# Altium footprint library lib_protel_HC.PCBLIB: 724 footprints (part 45 of 46)
Each footprint in its own frame and in the unit in brackets; x right, y up, seen from the top. Pads: shape width x height; smd on the part's side, far side on the other; paste and mask are expansions set on the pad; w line width, h text height; cw(c..) or ccw(c..) is an arc to the next point about the centre after c.
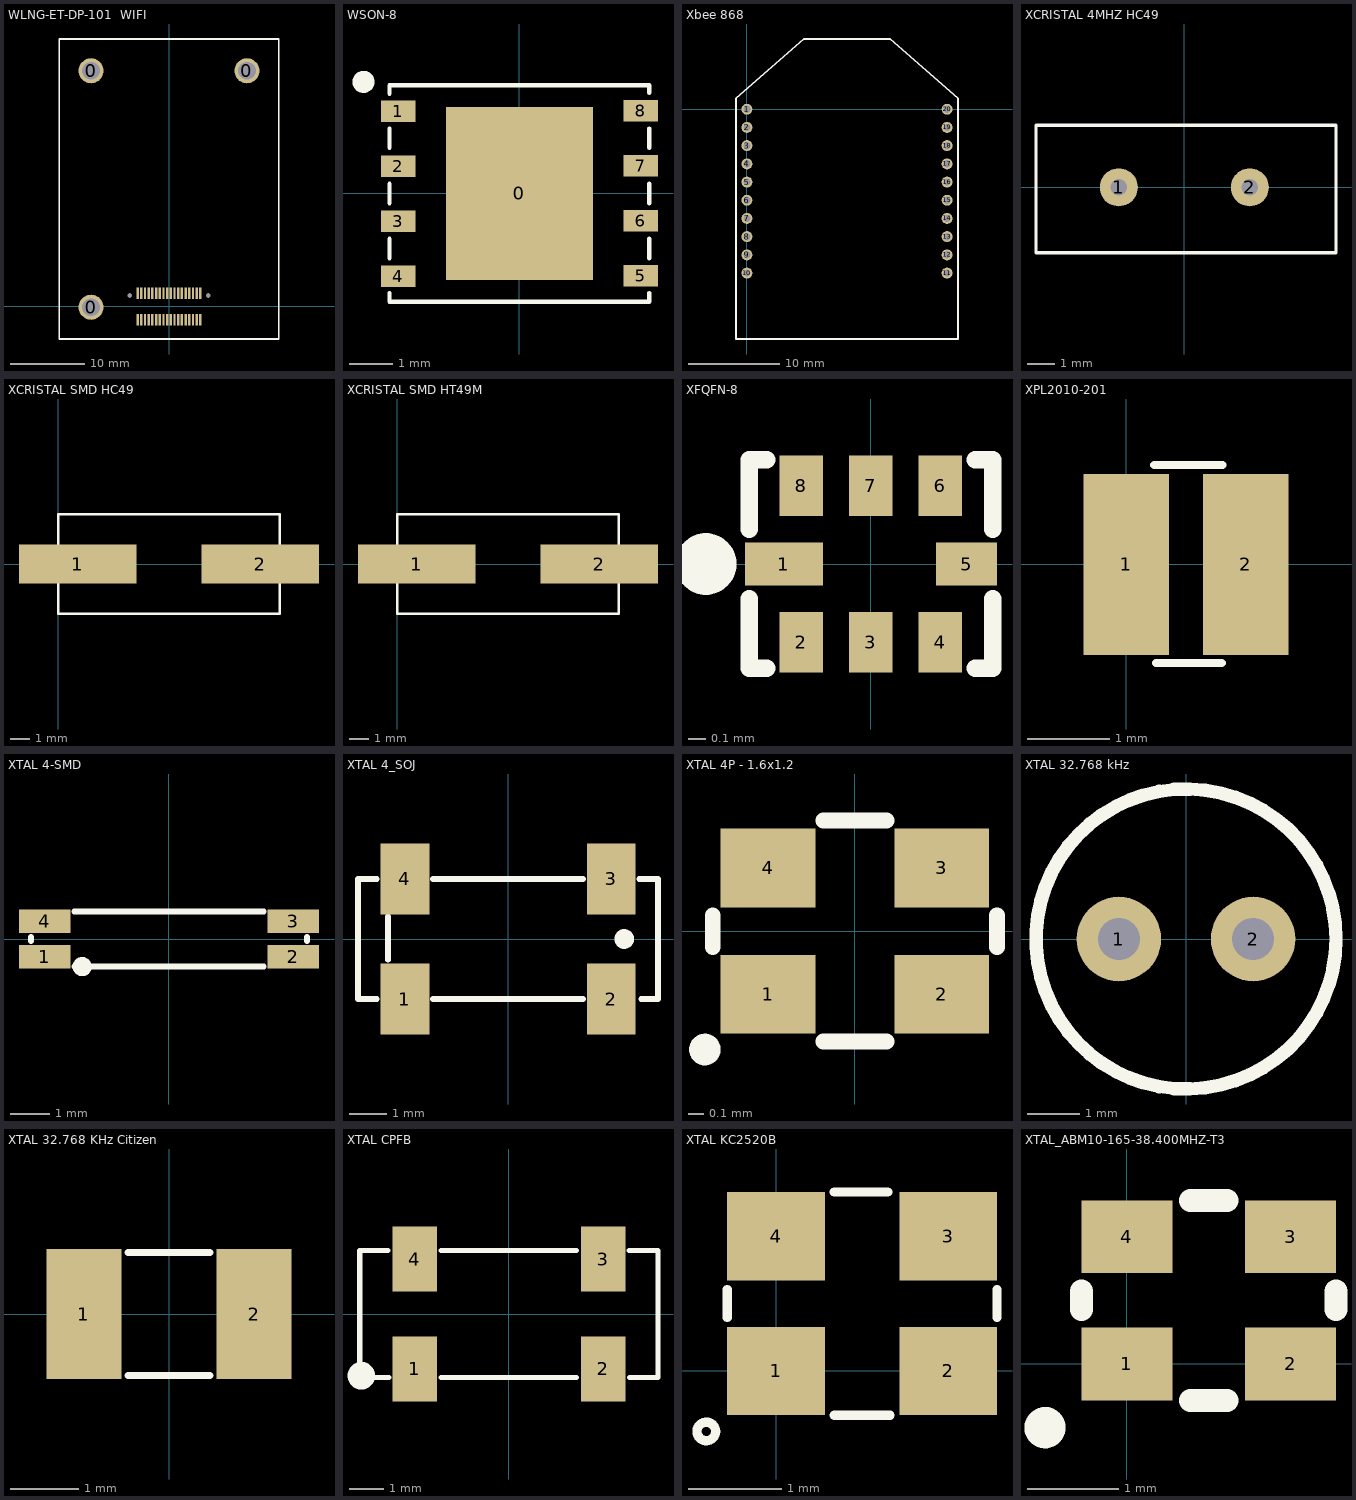
[diagram p44: the footprints below, top view; thin cyan lines are the x and y axes]

## WLNG-ET-DP-101  WIFI [mm]
height 12.92
pads (41):
  round 3.4 hole 2.4: 0(-10.55,-0.1) 0(-10.55,31.9) 0(10.55,31.9)
  rect 0x0 hole 0.65: 0(-5.3,1.5) 0(5.3,1.5)
  rect 0.32x1.6 smd: 1(4.25,-1.8) 2(4.25,1.8) 3(3.75,-1.8) 4(3.75,1.8) 5(3.25,-1.8) 6(3.25,1.8) 7(2.75,-1.8) 8(2.75,1.8) 9(2.25,-1.8) 10(2.25,1.8) 11(1.75,-1.8) 12(1.75,1.8) 13(1.25,-1.8) 14(1.25,1.8) 15(0.75,-1.8) 16(0.75,1.8) 17(0.25,-1.8) 18(0.25,1.8) 19(-0.25,-1.8) 20(-0.25,1.8) 21(-0.75,-1.8) 22(-0.75,1.8) 23(-1.25,-1.8) 24(-1.25,1.8) 25(-1.75,-1.8) 26(-1.75,1.8) 27(-2.25,-1.8) 28(-2.25,1.8) 29(-2.75,-1.8) 30(-2.75,1.8) 31(-3.25,-1.8) 32(-3.25,1.8) 33(-3.75,-1.8) 34(-3.75,1.8) 35(-4.25,-1.8) 36(-4.25,1.8)
Top Overlay:
  lines w0.254: -14.85,-4.4 14.85,-4.4 14.85,36.2 -14.85,36.2 -14.85,-4.4

## WSON-8 [mm]
height 0.8
pads (9):
  rect 3.4x4 smd: 0(0,0)
  rect 0.8x0.5 smd: 1(-2.8,1.9) 2(-2.8,0.63) 3(-2.8,-0.64) 4(-2.8,-1.91) 5(2.8,-1.9) 6(2.8,-0.63) 7(2.8,0.64) 8(2.8,1.91)
Top Overlay:
  circle w0.254: c-3.6,2.575 r0.127
  lines w0.1: -3,-2.3 -3,-2.5 3,-2.5 3,-2.3 ; -3,-1.5 -3,-1.05 ; -3,-0.225 -3,0.225 ; -3,1.05 -3,1.5 ; -3,2.3 -3,2.5 3,2.5 3,2.325 ; 3,-1.5 3,-1.05 ; 3,-0.225 3,0.225 ; 3,1.05 3,1.5
3D body "User Library-WSON-8.STEP": height 0.8, standoff 0, extent -3,-2.5 3,2.5

## Xbee 868 [mm] "Xbee 868MHz 20 pin - 2mm"
height 7.93
pads (20):
  round 1.2 hole 0.8: 1(0,0) 2(0,-2) 3(0,-4) 4(0,-6) 5(0,-8) 6(0,-10) 7(0,-12) 8(0,-14) 9(0,-16) 10(0,-18) 11(21.996,-18) 12(21.996,-16) 13(21.996,-14) 14(21.996,-12) 15(21.996,-10) 16(21.996,-8) 17(21.996,-6) 18(21.996,-4) 19(21.996,-2) 20(21.996,0)
Top Overlay:
  lines w0.2: -1.194,-25.248 -1.194,1.194 6.236,7.722 15.761,7.722 23.19,1.194 23.19,-25.248 -1.194,-25.248
3D body "User Library-XBeeProS1-1.STEP": height 12.82, standoff -3.74, extent -0.865,-25.148 22.865,7.792

## XCRISTAL 4MHZ HC49 [mm] "RELOJ PERFIL BAJO"
height 4
pads (2):
  round 1.4 on Top hole 0.6: 1(-2.413,0) 2(2.413,0)
Top Overlay:
  lines w0.127: -5.461,-2.413 -5.461,2.286 5.588,2.286 5.588,-2.413 -5.461,-2.413

## XCRISTAL SMD HC49 [mm] "RELOJ SMD DE 4MHZ"
height 4.3
pads (2):
  rect 6x2 smd: 1(1,0) 2(10.3,0)
Top Overlay:
  lines w0.127: 0,-2.54 11.303,-2.54 11.303,2.54 0,2.54 0,-2.54

## XCRISTAL SMD HT49M [mm] "RELOJ SMD DE 4MHZ"
height 4.5
pads (2):
  rect 6x2 smd: 1(1,0) 2(10.3,0)
Top Overlay:
  lines w0.127: 0,-2.54 11.303,-2.54 11.303,2.54 0,2.54 0,-2.54

## XFQFN-8 [mm] "encapsulado para FXMAR2102UMX"
pads (8):
  rect 0.45x0.25 smd: 1(-0.5,0)
  rect 0.25x0.35 smd: 2(-0.4,-0.45) 3(0,-0.45) 4(0.4,-0.45) 6(0.4,0.45) 7(0,0.45) 8(-0.4,0.45)
  rect 0.35x0.25 smd: 5(0.55,0)
Top Overlay:
  circle w0.254: c-0.95,0 r0.05
  lines w0.1: -0.7,-0.2 -0.7,-0.6 -0.6,-0.6 ; -0.7,0.2 -0.7,0.6 -0.6,0.6 ; 0.6,-0.6 0.7,-0.6 0.7,-0.2 ; 0.6,0.6 0.7,0.6 0.7,0.2

## XPL2010-201 [mm] "BOBINA XPL2010-201ML"
height 1
pads (2):
  rect 1.04x2.2 smd: 1(0,0) 2(1.45,0)
Top Overlay:
  lines w0.1: 0.34,1.21 1.17,1.21 ; 0.36,-1.2 1.16,-1.2
3D body "XPL2010.step": height 0.95, standoff -0.05, extent -0.325,-1.1 1.775,1.1

## XTAL 4-SMD [mm] "CM13032768"
pads (4):
  rect 1.3x0.6 smd mask+0.05: 1(-3.15,-0.45) 2(3.15,-0.45) 3(3.15,0.45) 4(-3.15,0.45)
Top Overlay:
  circle w0.2: c-2.2,-0.7 r0.141
  lines w0.15: -3.5,-0.05 -3.5,0.05 ; -2.4,-0.7 2.4,-0.7 ; -2.4,0.7 2.4,0.7 ; 3.5,-0.05 3.5,0.05
3D body "User Library-KX-327LT.STEP": height 1.4, standoff 0, extent -3.45,-0.75 3.45,0.75

## XTAL 4_SOJ [mm]
pads (4):
  rect 1.3x1.9 smd: 1(-2.75,-1.6) 2(2.75,-1.6) 3(2.75,1.6) 4(-2.75,1.6)
Top Overlay:
  circle w0.3: c3.1,0 r0.112
  lines w0.15: -3.5,-1.6 -4,-1.6 -4,1.6 -3.5,1.6 ; -3.2,-0.55 -3.2,0.6 ; -2,-1.6 2,-1.6 ; -2,1.6 2,1.6 ; 3.5,1.6 4,1.6 4,-1.6 3.55,-1.6
3D body "User Library-ABS25.STEP": height 2.7, standoff -0.01, extent -4,-2 4,2

## XTAL 4P - 1.6x1.2 [mm]
height 0.7
pads (4):
  rect 0.6x0.5 smd: 1(-0.55,-0.4) 2(0.55,-0.4) 3(0.55,0.4) 4(-0.55,0.4)
Top Overlay:
  circle w0.1: c-0.95,-0.75 r0.05
  lines w0.1: -0.9,-0.1 -0.9,0.1 ; -0.2,-0.7 0.2,-0.7 ; -0.2,0.7 0.2,0.7 ; 0.9,-0.1 0.9,0.1
3D body "ASCO.STEP": height 0.6, standoff 0, extent -0.8,-0.6 0.8,0.6

## XTAL 32.768 kHz [mm]
pads (2):
  round 1.6 on Top hole 0.8: 1(-1.27,0) 2(1.27,0)
Top Overlay:
  circle w0.254: c0,0 r2.84

## XTAL 32.768 KHz Citizen [mm] "Reloj 32.768KHz pequeño"
height 0.9
pads (2):
  rect 1.1x1.9 smd: 1(-1.25,0) 2(1.25,0)
Top Overlay:
  lines w0.1: -0.6,-0.9 0.6,-0.9 ; -0.6,0.9 0.6,0.9
3D body "User Library-ABS07.STEP": height 0.91, standoff 0, extent -1.585,-0.76 1.635,0.76

## XTAL CPFB [mm] "CLOCK 32.768KHz"
pads (4):
  rect 1.3x1.9 smd mask+0.05: 1(-2.75,-1.6) 2(2.75,-1.6) 3(2.75,1.6) 4(-2.75,1.6)
Top Overlay:
  circle w0.6: c-4.3,-1.8 r0.1
  lines w0.15: -3.525,1.85 -4.35,1.85 -4.35,-1.85 -3.5,-1.85 ; -1.975,-1.85 1.975,-1.85 ; -1.975,1.85 1.975,1.85 ; 3.5,1.85 4.35,1.85 4.35,-1.85 3.525,-1.85

## XTAL KC2520B [mm] "CLOCK 24MHZ"
height 0.7
pads (4):
  rect 1.05x0.95 smd mask+0.05: 1(0,0) 2(1.85,0) 3(1.85,1.45) 4(0,1.45)
Top Overlay:
  circle w0.1: c-0.75,-0.65 r0.1
  lines w0.1: -0.525,0.575 -0.525,0.875 ; 0.625,-0.475 1.225,-0.475 ; 0.625,1.925 1.2,1.925 ; 2.375,0.575 2.375,0.875

## XTAL_ABM10-165-38.400MHZ-T3 [mm]
pads (4):
  rect 1x0.8 smd: 1(0,0) 2(1.8,0) 3(1.8,1.4) 4(0,1.4)
Top Overlay:
  circle w0.254: c-0.9,-0.7 r0.1
  lines w0.254: -0.5,0.6 -0.5,0.8 ; 0.7,-0.4 1.1,-0.4 ; 0.7,1.8 1.1,1.8 ; 2.3,0.6 2.3,0.8
3D body "User Library-ABM10_Xtal.step": height 0.7, standoff -0.01, extent -0.4,-0.35 2.2,1.75